# Altium footprint library IS12.01.02.PcbLib: 38 footprints (part 3 of 3)
Each footprint in its own frame and in the unit in brackets; x right, y up, seen from the top. Pads: shape width x height; smd on the part's side, far side on the other; paste and mask are expansions set on the pad; w line width, h text height; cw(c..) or ccw(c..) is an arc to the next point about the centre after c.
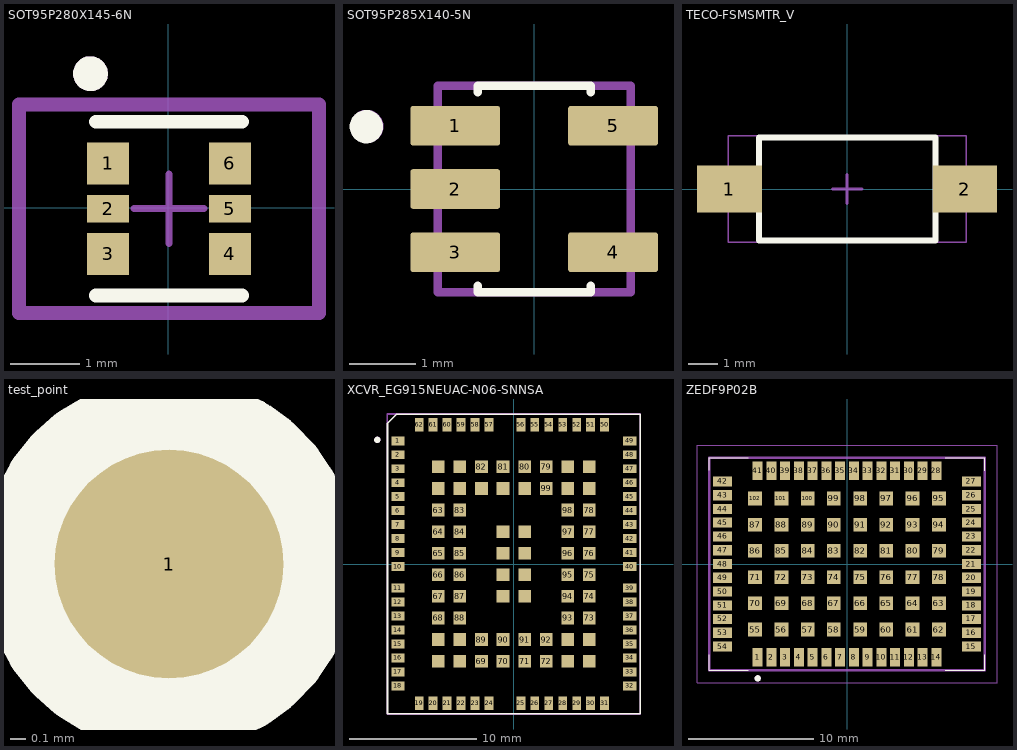
[diagram p2: the footprints below, top view; thin cyan lines are the x and y axes]

## SOT95P280X145-6N [mm]
pads (6):
  rect 0.6x0.6 smd paste+0 mask+0.051: 1(-0.864,0.64) 3(-0.864,-0.66) 4(0.889,-0.66) 6(0.889,0.64)
  rect 0.6x0.4 smd paste+0 mask+0.051: 2(-0.864,-0.01) 5(0.889,-0.01)
Top Overlay:
  circle w0.25: c-1.118,1.93 r0.125
  lines w0.2: -1.038,-1.26 1.062,-1.26 ; -1.038,1.24 1.062,1.24
Top Assembly:
  circle w0.25: c-1.118,1.93 r0.125
  lines w0.2: -2.144,-1.51 -2.144,1.49 2.168,1.49 2.168,-1.51 -2.144,-1.51
Top Courtyard:
  lines w0.2: -2.144,-1.51 -2.144,1.49 2.168,1.49 2.168,-1.51 -2.144,-1.51
Top Component Center:
  lines w0.1: -0.488,-0.01 0.512,-0.01 ; 0.012,-0.51 0.012,0.49
3D body "Trans_Nexperia_NX3008NBKS_115_eec.STEP": height 0.25, standoff 0, extent -2.144,-1.51 2.168,1.49

## SOT95P285X140-5N [mm]
pads (5):
  rrect15% 1.35x0.6 smd: 1(-1.185,0.95) 2(-1.185,0) 3(-1.185,-0.95) 4(1.185,-0.95) 5(1.185,0.95)
Top Overlay:
  circle w0.25: c-2.521,0.936 r0.125
  lines w0.127: -0.85,-1.45 -0.85,-1.55 0.85,-1.55 0.85,-1.45 ; -0.85,1.45 -0.85,1.55 0.85,1.55 0.85,1.45
Top Assembly:
  circle w0.25: c-2.515,0.94 r0.125
  lines w0.127: -1.448,-1.549 1.448,-1.549 1.448,1.549 -1.448,1.549 -1.448,-1.549
3D body "step_temp.STEP": height 1.4, standoff 0, extent -1.4,-1.5 1.4,1.5

## TECO-FSMSMTR_V [mm]
pads (2):
  rect 2.2x1.6 smd mask+0.051: 1(-4,0)
  rect 2.18x1.6 smd mask+0.051: 2(4,0)
Top Overlay:
  lines w0.2: -3,-1.75 -3,1.75 3,1.75 3,-1.75 -3,-1.75
Top Assembly:
  lines w0.05: -4.039,-1.803 4.039,-1.803 4.039,1.803 -4.039,1.803 -4.039,-1.803
Top Courtyard:
  lines w0.1: -0.5,0 0.5,0 ; 0,-0.5 0,0.5
3D body "G73 button.STEP": height 2.5, standoff 0, extent -4,-1.75 4,1.75

## test_point [mil]
pads (1):
  round 60 smd mask+3: 1(0,0)
Top Overlay:
  circle w20: c0,0 r39.37

## XCVR_EG915NEUAC-N06-SNNSA [mm]
pads (126):
  rect 1.05x0.7 smd mask+0.051: 1(-9.125,9.7) 2(-9.125,8.6) 3(-9.125,7.5) 4(-9.125,6.4) 5(-9.125,5.3) 6(-9.125,4.2) 7(-9.125,3.1) 8(-9.125,2) 9(-9.125,0.9) 10(-9.125,-0.2) 11(-9.125,-1.9) 12(-9.125,-3) 13(-9.125,-4.1) 14(-9.125,-5.2) 15(-9.125,-6.3) 16(-9.125,-7.4) 17(-9.125,-8.5) 18(-9.125,-9.6) 32(9.125,-9.6) 33(9.125,-8.5) 34(9.125,-7.4) 35(9.125,-6.3) 36(9.125,-5.2) 37(9.125,-4.1) 38(9.125,-3) 39(9.125,-1.9) 40(9.125,-0.2) 41(9.125,0.9) 42(9.125,2) 43(9.125,3.1) 44(9.125,4.2) 45(9.125,5.3) 46(9.125,6.4) 47(9.125,7.5) 48(9.125,8.6) 49(9.125,9.7)
  rect 0.7x1.05 smd mask+0.051: 19(-7.45,-10.975) 20(-6.35,-10.975) 21(-5.25,-10.975) 22(-4.15,-10.975) 23(-3.05,-10.975) 24(-1.95,-10.975) 25(0.55,-10.975) 26(1.65,-10.975) 27(2.75,-10.975) 28(3.85,-10.975) 29(4.95,-10.975) 30(6.05,-10.975) 31(7.15,-10.975) 50(7.15,10.975) 51(6.05,10.975) 52(4.95,10.975) 53(3.85,10.975) 54(2.75,10.975) 55(1.65,10.975) 56(0.55,10.975) 57(-1.95,10.975) 58(-3.05,10.975) 59(-4.15,10.975) 60(-5.25,10.975) 61(-6.35,10.975) 62(-7.45,10.975)
  rect 1x1 smd mask+0.051: 63(-5.95,4.25) 64(-5.95,2.55) 65(-5.95,0.85) 66(-5.95,-0.85) 67(-5.95,-2.55) 68(-5.95,-4.25) 69(-2.55,-7.65) 70(-0.85,-7.65) 71(0.85,-7.65) 72(2.55,-7.65) 73(5.95,-4.25) 74(5.95,-2.55) 75(5.95,-0.85) 76(5.95,0.85) 77(5.95,2.55) 78(5.95,4.25) 79(2.55,7.65) 80(0.85,7.65) 81(-0.85,7.65) 82(-2.55,7.65) 83(-4.25,4.25) 84(-4.25,2.55) 85(-4.25,0.85) 86(-4.25,-0.85) 87(-4.25,-2.55) 88(-4.25,-4.25) 89(-2.55,-5.95) 90(-0.85,-5.95) 91(0.85,-5.95) 92(2.55,-5.95) 93(4.25,-4.25) 94(4.25,-2.55) 95(4.25,-0.85) 96(4.25,0.85) 97(4.25,2.55) 98(4.25,4.25) 99(2.55,5.95) 100(0.85,5.95) 101(-0.85,5.95) 102(-2.55,5.95) 103(-5.95,7.65) 104(-5.95,5.95) 105(-5.95,-5.95) 106(-5.95,-7.65) 107(-4.25,-7.65) 108(4.25,-7.65) 109(5.95,-7.65) 110(5.95,-5.95) 111(5.95,5.95) 112(5.95,7.65) 113(4.25,7.65) 114(-4.25,7.65) 115(-4.25,5.95) 116(-4.25,-5.95) 117(4.25,-5.95) 118(4.25,5.95) 119(-0.85,2.55) 120(-0.85,0.85) 121(-0.85,-0.85) 122(-0.85,-2.55) 123(0.85,-2.55) 124(0.85,-0.85) 125(0.85,0.85) 126(0.85,2.55)
Top Overlay:
  circle w0.25: c-10.75,9.775 r0.125
  lines w0.127: -9.95,-11.8 -8.12,-11.8 9.95,-11.8 9.95,-10.27 9.95,11.8 7.82,11.8 -9.231,11.8 -9.95,11.081 -9.95,-10.27 -9.95,-11.8
Top Assembly:
  circle w0.25: c-10.744,9.779 r0.125
  lines w0.127: -9.957,-11.811 9.957,-11.811 9.957,11.811 -9.957,11.811 -9.957,-11.811
3D body "step_temp.STEP": height 2.6, standoff 0, extent -9.95,-11.8 9.95,11.8

## ZEDF9P02B [mm]
pads (102):
  rect 0.8x1.5 smd: 1(-7.15,-7.45) 2(-6.05,-7.45) 3(-4.95,-7.45) 4(-3.85,-7.45) 5(-2.75,-7.45) 6(-1.65,-7.45) 7(-0.55,-7.45) 8(0.55,-7.45) 9(1.65,-7.45) 10(2.75,-7.45) 11(3.85,-7.45) 12(4.95,-7.45) 13(6.05,-7.45) 14(7.15,-7.45) 28(7.15,7.45) 29(6.05,7.45) 30(4.95,7.45) 31(3.85,7.45) 32(2.75,7.45) 33(1.65,7.45) 34(0.55,7.45) 35(-0.55,7.45) 36(-1.65,7.45) 37(-2.75,7.45) 38(-3.85,7.45) 39(-4.95,7.45) 40(-6.05,7.45) 41(-7.15,7.45)
  rect 1.5x0.8 smd: 15(9.95,-6.6) 16(9.95,-5.5) 17(9.95,-4.4) 18(9.95,-3.3) 19(9.95,-2.2) 20(9.95,-1.1) 21(9.95,0) 22(9.95,1.1) 23(9.95,2.2) 24(9.95,3.3) 25(9.95,4.4) 26(9.95,5.5) 27(9.95,6.6) 42(-9.95,6.6) 43(-9.95,5.5) 44(-9.95,4.4) 45(-9.95,3.3) 46(-9.95,2.2) 47(-9.95,1.1) 48(-9.95,0) 49(-9.95,-1.1) 50(-9.95,-2.2) 51(-9.95,-3.3) 52(-9.95,-4.4) 53(-9.95,-5.5) 54(-9.95,-6.6)
  rect 1.1x1.1 smd: 55(-7.35,-5.25) 56(-5.25,-5.25) 57(-3.15,-5.25) 58(-1.05,-5.25) 59(1.05,-5.25) 60(3.15,-5.25) 61(5.25,-5.25) 62(7.35,-5.25) 63(7.35,-3.15) 64(5.25,-3.15) 65(3.15,-3.15) 66(1.05,-3.15) 67(-1.05,-3.15) 68(-3.15,-3.15) 69(-5.25,-3.15) 70(-7.35,-3.15) 71(-7.35,-1.05) 72(-5.25,-1.05) 73(-3.15,-1.05) 74(-1.05,-1.05) 75(1.05,-1.05) 76(3.15,-1.05) 77(5.25,-1.05) 78(7.35,-1.05) 79(7.35,1.05) 80(5.25,1.05) 81(3.15,1.05) 82(1.05,1.05) 83(-1.05,1.05) 84(-3.15,1.05) 85(-5.25,1.05) 86(-7.35,1.05) 87(-7.35,3.15) 88(-5.25,3.15) 89(-3.15,3.15) 90(-1.05,3.15) 91(1.05,3.15) 92(3.15,3.15) 93(5.25,3.15) 94(7.35,3.15) 95(7.35,5.25) 96(5.25,5.25) 97(3.15,5.25) 98(1.05,5.25) 99(-1.05,5.25) 100(-3.15,5.25) 101(-5.25,5.25) 102(-7.35,5.25)
Top Overlay:
  circle w0.25: c-7.144,-9.148 r0.125
  lines w0.1: -11,-8.5 -11,-7.25 -11,-8.5 ; -11,-8.5 -7.9,-8.5 -11,-8.5 ; -11,8.5 -11,7.5 -11,8.5 ; -11,8.5 -7.9,8.5 -11,8.5 ; 11,-8.5 7.85,-8.5 11,-8.5 ; 11,-8.5 11,-7.25 11,-8.5 ; 11,8.5 7.85,8.5 11,8.5 ; 11,8.5 11,7.45 11,8.5
Top Assembly:
  circle w0.25: c-7.137,-9.144 r0.125
  lines w0.2: -11,-8.5 11,-8.5 11,8.5 -11,8.5 -11,-8.5
Mechanical 20:
  lines w0.1: -12,-9.5 12,-9.5 12,9.5 -12,9.5 -12,-9.5
3D body "u-blox ZED-F9P.stp": height 2.2, standoff -0.04, extent -11,-8.5 11,8.5